# Altium footprint library Module's & Board's.PcbLib: 19 footprints (part 1 of 2)
Each footprint in its own frame and in the unit in brackets; x right, y up, seen from the top. Pads: shape width x height; smd on the part's side, far side on the other; paste and mask are expansions set on the pad; w line width, h text height; cw(c..) or ccw(c..) is an arc to the next point about the centre after c.
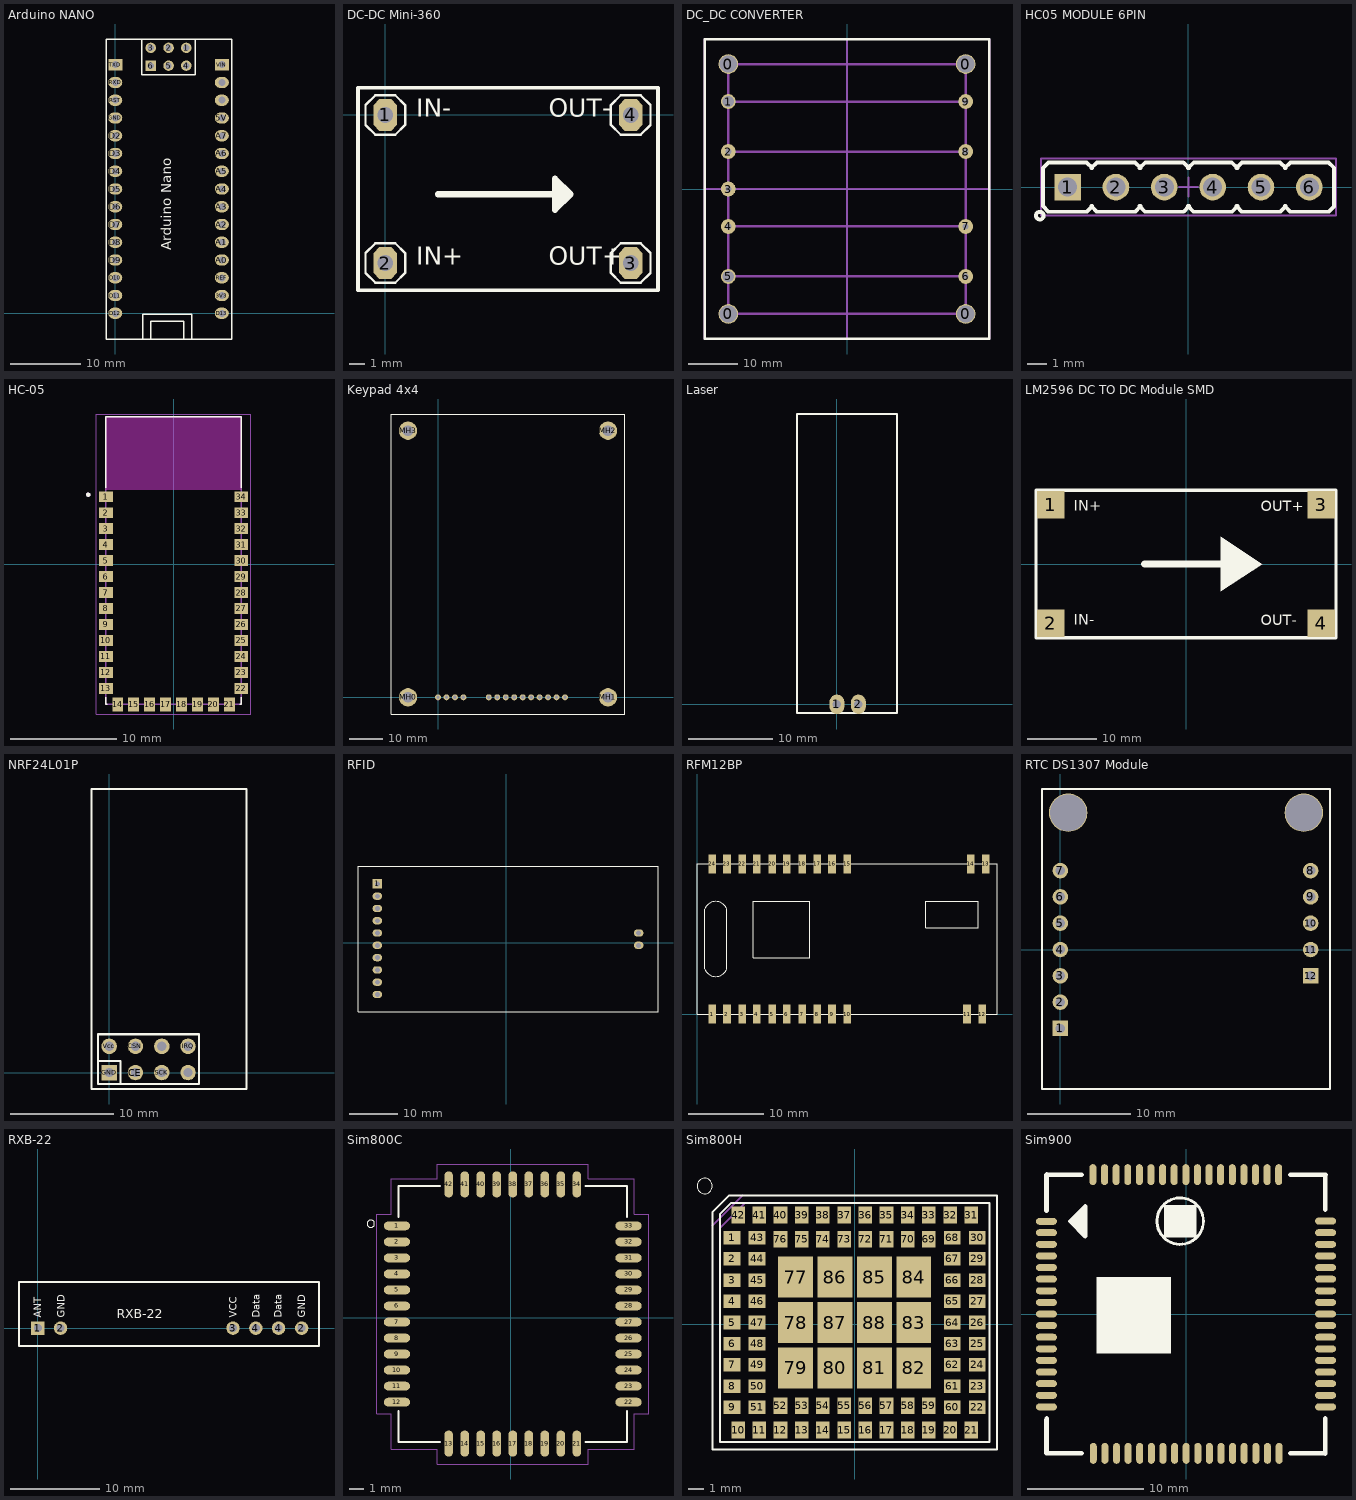
[diagram p0: the footprints below, top view; thin cyan lines are the x and y axes]

## Arduino NANO [mm]
pads (36):
  round 1.5 hole 0.9: 1(10.16,37.973) 2(7.62,37.973) 3(5.08,37.973) 4(10.16,35.433) 5(7.62,35.433)
  oval 2x1.6 hole 1: 3V3(15.24,2.54) 5V(15.24,27.94) A0(15.24,7.62) A1(15.24,10.16) A2(15.24,12.7) A3(15.24,15.24) A4(15.24,17.78) A5(15.24,20.32) A6(15.24,22.86) A7(15.24,25.4) D2(0,25.4) D3(0,22.86) D4(0,20.32) D5(0,17.78) D6(0,15.24) D7(0,12.7) D8(0,10.16) D9(0,7.62) D10(0,5.08) D11(0,2.54) D12(0,0) D13(15.24,0) GND(0,27.94) GND1(15.24,33.02) REF(15.24,5.08) RST(0,30.48) RST1(15.24,30.48) RXD(0,33.02)
  rect 1.5x1.5 hole 0.9: 6(5.08,35.433)
  rect 2x1.6 hole 1: TXD(0,35.56) VIN(15.24,35.56)
Top Overlay:
  lines w0.2: 3.81,39.243 3.81,34.163 11.43,34.163 11.43,39.243 ; 3.937,-3.683 3.937,-0.127 10.922,-0.127 10.922,-3.683 ; 5.08,-3.683 5.08,-1.143 9.779,-1.143 9.779,-3.683 ; -1.27,-3.683 16.637,-3.683 16.637,39.243 -1.27,39.243 -1.27,-3.683
  text "Arduino Nano" at 8.001,9.017 h1.4
3D body "PBD-2.stp": height 8.5, standoff -3.15, extent 6.35,34.163 8.89,39.243
3D body "PBD-2.stp": height 8.5, standoff -3.15, extent 3.81,34.163 6.35,39.243
3D body "PBD-2.stp": height 8.5, standoff -3.15, extent 8.89,34.163 11.43,39.243
3D body "PBS-1.stp": height 8.5, standoff -3.15, extent -1.27,34.29 1.27,36.83
3D body "PBD-2.stp": height 8.5, standoff -3.15, extent -1.27,-1.27 1.27,3.81
3D body "PBD-2.stp": height 8.5, standoff -3.15, extent -1.27,3.81 1.27,8.89
3D body "PBD-2.stp": height 8.5, standoff -3.15, extent -1.27,8.89 1.27,13.97
3D body "PBD-2.stp": height 8.5, standoff -3.15, extent -1.27,13.97 1.27,19.05
3D body "PBD-2.stp": height 8.5, standoff -3.15, extent -1.27,19.05 1.27,24.13
3D body "PBD-2.stp": height 8.5, standoff -3.15, extent -1.27,24.13 1.27,29.21
3D body "PBD-2.stp": height 8.5, standoff -3.15, extent -1.27,29.21 1.27,34.29
3D body "PBS-1.stp": height 8.5, standoff -3.15, extent 13.97,34.29 16.51,36.83
3D body "PBD-2.stp": height 8.5, standoff -3.15, extent 13.97,-1.27 16.51,3.81
3D body "PBD-2.stp": height 8.5, standoff -3.15, extent 13.97,3.81 16.51,8.89
3D body "PBD-2.stp": height 8.5, standoff -3.15, extent 13.97,8.89 16.51,13.97
3D body "PBD-2.stp": height 8.5, standoff -3.15, extent 13.97,13.97 16.51,19.05
3D body "PBD-2.stp": height 8.5, standoff -3.15, extent 13.97,19.05 16.51,24.13
3D body "PBD-2.stp": height 8.5, standoff -3.15, extent 13.97,24.13 16.51,29.21
3D body "PBD-2.stp": height 8.5, standoff -3.15, extent 13.97,29.21 16.51,34.29
3D body "User Library-arduino_nano.STEP": height 21.1, standoff 2.5, extent -1.27,-5.609 16.73,39.391

## DC-DC Mini-360 [mil]
pads (4):
  oct 60x80 hole 40: 1(0,0) 2(0,-374.02) 3(620.08,-374.02) 4(620.08,0)
Top Overlay:
  rectangle: -10,-10 10,10
  rectangle: 610.08,-10 630.08,10
  rectangle: -10,-384.02 10,-364.02
  rectangle: 610.08,-384.02 630.08,-364.02
  lines w6: -50,-399.02 -25,-424.02 25,-424.02 50,-399.02 50,-349.02 25,-324.02 -25,-324.02 -50,-349.02 -50,-399.02 ; -50,-25 -25,-50 25,-50 50,-25 50,25 25,50 -25,50 -50,25 -50,-25 ; 570.08,-399.02 595.08,-424.02 645.08,-424.02 670.08,-399.02 670.08,-349.02 645.08,-324.02 595.08,-324.02 570.08,-349.02 570.08,-399.02 ; 570.08,-25 595.08,-50 645.08,-50 670.08,-25 670.08,25 645.08,50 595.08,50 570.08,25 570.08,-25
  lines w9.84: -68.9,-442.91 688.98,-442.91 688.98,68.9 -68.9,68.9 -68.9,-442.91
  lines w15.75: 133.43,-200 468.07,-200 ; 437,-182.15 440,-219.15 ; 448,-209.15 448,-187.15 ; 428.7,-160.63 468.07,-200 ; 428.7,-160.63 468.07,-200 ; 428.7,-160.63 428.7,-239.37 468.07,-200
  text "IN-" at 78.74,-19.68 h78.74
  text "IN+" at 78.74,-393.7 h78.74
  text "OUT-" at 413.39,-19.68 h78.74
  text "OUT+" at 413.39,-393.7 h78.74
3D body "PLS-1.step": height 336.22, standoff -114.17, extent -49,-49.99 51,50.01
3D body "PLS-1.step": height 336.22, standoff -114.17, extent 571.08,-49.99 671.08,50.01
3D body "PLS-1.step": height 336.22, standoff -114.17, extent -49,-424.01 51,-324.01
3D body "PLS-1.step": height 336.22, standoff -114.17, extent 571.08,-424.01 671.08,-324.01

## DC_DC CONVERTER [mm] "VHD150-12S12"
height 20
pads (13):
  round 4 hole 3.5: 0(-24.13,-25.4) 0(-24.13,25.4) 0(24.13,-25.4) 0(24.13,25.4)
  round 3 hole 2.3: 1(-24.13,17.78) 5(-24.13,-17.78)
  round 3 hole 1.2: 2(-24.13,7.62) 3(-24.13,0) 4(-24.13,-7.62) 6(24.13,-17.78) 7(24.13,-7.62) 8(24.13,7.62) 9(24.13,17.78)
Top Overlay:
  lines w0.5: -28.956,-30.48 28.956,-30.48 28.956,30.48 -28.956,30.48 -28.956,-30.48
Mechanical 15:
  lines w0.5: -28.9,0 0,0 ; -24.13,-17.78 24.13,-17.78 ; -24.13,-7.62 24.13,-7.62 ; -24.13,7.62 24.13,7.62 ; -24.13,17.78 23.876,17.78 ; 24.13,22.86 24.13,25.4 ; 0,-30.5 -28.9,-30.5 -28.9,30.5 0,30.5 ; 0,-30.5 28.9,-30.5 28.9,0 ; 0,-30.5 0,0 ; 0,0 0,30.5 ; 0,0 28.9,0 ; 0,30.5 28.9,30.5 28.9,0 ; 24.13,25.4 0,25.4 -24.13,25.4 -24.13,0 -24.13,-25.4 0,-25.4 24.13,-25.4 24.13,0 24.13,25.4
3D body "User Library-Cosel_CBS200.STEP": height 13, standoff -4.78, extent -29.083,-30.65 29.117,30.65

## HC05 MODULE 6PIN [mm] "HC05 box-Designer Abbas Basereh"
height 40
pads (6):
  rect 1.4x1.4 / inner rect 1.4x1.4 / far side rect 1.4x2.2 hole 1 mask+0.1: 1(-6.35,0)
  round 1.4 / inner round 1.4 / far side oval 1.4x2.2 hole 1 mask+0.1: 2(-3.81,0) 3(-1.27,0) 4(1.27,0) 5(3.81,0) 6(6.35,0)
Top Overlay:
  circle w0.2: c-7.81,-1.5 r0.2
  lines w0.2: -5.11,-1 -4.81,-1.3 -2.81,-1.3 -2.51,-1 ; -5.11,1 -4.81,1.3 -2.81,1.3 -2.51,1 ; -5.05,-1 -5.35,-1.3 -7.35,-1.3 -7.65,-1 -7.65,1 -7.35,1.3 -5.35,1.3 -5.05,1 ; -2.57,-1 -2.27,-1.3 -0.27,-1.3 0.03,-1 ; -2.57,1 -2.27,1.3 -0.27,1.3 0.03,1 ; -0.025,-1 0.275,-1.3 2.275,-1.3 2.575,-1 ; -0.025,1 0.275,1.3 2.275,1.3 2.575,1 ; 2.515,-1 2.815,-1.3 4.815,-1.3 5.115,-1 ; 2.515,1 2.815,1.3 4.815,1.3 5.115,1 ; 5.055,-1 5.355,-1.3 7.355,-1.3 7.64,-1.015 7.64,1.015 7.355,1.3 5.355,1.3 5.055,1
Mechanical 15:
  lines w0.1: -0.5,0 0.5,0 ; 0,-0.5 0,0.5 ; -7.75,-1.5 7.75,-1.5 7.75,1.5 -7.75,1.5 -7.75,-1.5
3D body "User Library-hc05.STEP": height 40, standoff -2.6, extent -8.025,-0.5 8.075,5.4

## HC-05 [mm]
pads (34):
  rect 1.3x1 smd: 1(-6.35,6.325) 2(-6.35,4.825) 3(-6.35,3.325) 4(-6.35,1.825) 5(-6.35,0.325) 6(-6.35,-1.175) 7(-6.35,-2.675) 8(-6.35,-4.175) 9(-6.35,-5.675) 10(-6.35,-7.175) 11(-6.35,-8.675) 12(-6.35,-10.175) 13(-6.35,-11.675) 22(6.35,-11.675) 23(6.35,-10.175) 24(6.35,-8.675) 25(6.35,-7.175) 26(6.35,-5.675) 27(6.35,-4.175) 28(6.35,-2.675) 29(6.35,-1.175) 30(6.35,0.325) 31(6.35,1.825) 32(6.35,3.325) 33(6.35,4.825) 34(6.35,6.325)
  rect 1x1.3 smd: 14(-5.25,-13.175) 15(-3.75,-13.175) 16(-2.25,-13.175) 17(-0.75,-13.175) 18(0.75,-13.175) 19(2.25,-13.175) 20(3.75,-13.175) 21(5.25,-13.175)
Top Overlay:
  circle w0.2: c-8,6.5 r0.1
  lines w0.127: -6.35,-12.495 -6.35,-13.175 -6.22,-13.175 ; -6.35,7.145 -6.35,13.825 6.35,13.825 6.35,7.145 ; 6.22,-13.175 6.35,-13.175 6.35,-12.495
Keep-Out Layer:
  region: 6.35,6.95 -6.35,6.95 -6.35,13.85 6.35,13.85
  region: 6.35,6.95 -6.35,6.95 -6.35,13.85 6.35,13.85
  region: 6.35,6.95 -6.35,6.95 -6.35,13.85 6.35,13.85
Mechanical 13:
  circle w0.2: c-8,6.5 r0.1
  lines w0.127: -6.35,-13.175 6.35,-13.175 6.35,13.825 -6.35,13.825 -6.35,-13.175
Mechanical 15:
  lines w0.05: -7.25,-14.075 7.25,-14.075 7.25,14.075 -7.25,14.075 -7.25,-14.075
3D body "User Library-HC05(06).step": height 4.31, standoff 0, extent -6.5,-13.5 6.5,13.5

## Keypad 4x4 [mil] "Matrix Keyboard 4x4"
pads (18):
  round 70 hole 40: 1(0,0) 2(100,0) 3(200,0) 4(300,0) 5(700,0) 6(800,0) 7(900,0) 8(1000,0) 9(600,0) 10(1100,0) 11(1200,0) 12(1300,0) 13(1400,0) 14(1500,0)
  round 216.54 hole 125.98: MH0(-354.33,0) MH1(2007.87,0) MH2(2007.87,3149.61) MH3(-354.33,3149.61)
Top Overlay:
  lines w10: -551.18,-196.85 2204.72,-196.85 2204.72,3346.46 -551.18,3346.46 -551.18,-196.85
3D body "Keyboard.STEP": height 874.82, standoff 590.55, extent -551.18,-196.85 2204.72,3346.46
3D body "Spacer.STEP": height 590.55, standoff -196.85, extent 1895.36,3052.17 2120.39,3247.05
3D body "Spacer.STEP": height 590.55, standoff -196.85, extent 1895.36,-97.44 2120.39,97.44
3D body "Spacer.STEP": height 590.55, standoff -196.85, extent -466.84,-97.44 -241.81,97.44
3D body "Spacer.STEP": height 590.55, standoff -196.85, extent -466.85,3052.16 -241.82,3247.05
3D body "header10-15mm.STEP": height 710, standoff -100, extent 550,-50 1550,50
3D body "header04-15mm.STEP": height 710, standoff -100, extent -50,-50 350,50

## Laser [mil]
pads (2):
  oval 70x90 hole 40: 1(0,0) 2(100,0)
Top Overlay:
  lines w10: -186.22,-40 -186.22,1349.21 280,1349.21 280,-40 -186.22,-40
3D body "laser.STEP": height 472.44, standoff 0, extent -186.22,50 286.22,1435.83
3D body: height 241.21, standoff 231.23, extent 45,1160 54.96,2160

## LM2596 DC TO DC Module SMD [mm]
pads (4):
  rect 4x4 smd: 1(-19.55,8.55) 2(-19.55,-8.55) 3(19.55,8.55) 4(19.55,-8.55)
Top Overlay:
  region: 5,3.925 5,-3.975 11,-0.025
  lines w0.5: -21.7,-10.7 -21.7,10.7 21.7,10.7 21.7,-10.7 -21.7,-10.7
  lines w1: -6,0 5.775,0
  text "OUT-" at 10.829,-8.896 h1.52
  text "OUT+" at 10.829,7.604 h1.52
  text "IN-" at -16.272,-8.794 h1.52
  text "IN+" at -16.272,7.723 h1.52
3D body "User Library-BULVACK LM2596 DC-DC 1_25V-30V 3A-1.step": height 12.95, standoff -0.65, extent -21.65,-10.65 21.65,10.65

## NRF24L01P [mm] "NRFL01+ Module"
pads (8):
  round 1.5 hole 0.9: CE(2.54,0) CSN(2.54,2.54) IRQ(7.62,2.54) MISO(7.62,0) MOSI(5.08,2.54) SCK(5.08,0) Vcc(0,2.54)
  rect 1.5x1.5 hole 0.9: GND(0,0)
Top Overlay:
  lines w0.2: -1.1,1.1 1.1,1.1 1.1,-1.1 ; -1.72,-1.59 -1.72,27.41 13.28,27.41 13.28,-1.59 -1.72,-1.59 ; -1.1,-1.1 8.7,-1.1 8.7,3.7 -1.1,3.7 -1.1,-1.1
3D body "User Library-NRF24L01P Module.STEP": height 15.5, standoff 0.59, extent -1.72,-1.59 13.28,27.41

## RFID [mm] "RFID 2&10 PIN"
pads (12):
  rect 2x2 hole 1: 1(-26.632,12.141)
  oval 2x1.5 hole 1: 2(-26.632,9.601) 3(-26.632,7.061) 4(-26.632,4.521) 5(-26.632,1.981) 6(-26.632,-0.559) 7(-26.632,-3.099) 8(-26.632,-5.639) 9(-26.632,-8.179) 10(-26.632,-10.719) 11(27.368,1.981) 12(27.368,-0.559)
Top Overlay:
  lines w0.2: -30.632,-14.249 -30.632,15.751 31.368,15.751 31.368,-14.249 -30.632,-14.249
3D body: height 11.1, standoff 0, extent 5.639,-2.184 11.659,6.096
3D body: height 11.1, standoff 0, extent 1.448,-2.21 2.946,6.096
3D body: height 11.1, standoff 0, extent -5.232,-2.261 -0.584,6.096
3D body: height 11.1, standoff 0, extent -13.614,-2.184 -6.579,6.426
3D body: height 11, standoff 0, extent -30.632,-14.249 31.369,15.723

## RFM12BP [mm]
pads (24):
  rect 1x2.5 smd mask+0.5: 1(2,0) 2(4,0) 3(6,0) 4(8,0) 5(10,0) 6(12,0) 7(14,0) 8(16,0) 9(18,0) 10(20,0) 11(36,0) 12(38,0) 13(38.5,20) 14(36.5,20) 15(20,20) 16(18,20) 17(16,20) 18(14,20) 19(12,20) 20(10,20) 21(8,20) 22(6,20) 23(4,20) 24(2,20)
Top Overlay:
  lines w0.1: 0,0 40,0 40,20 0,20 0,0 ; 1,6 ccw(c2.5,6.625) 4,6 4,7.5 4,14 ccw(c2.5,13.375) 1,14 1,7.5 1,6 ; 7.5,7.5 7.5,10 7.5,15 15,15 15,7.5 7.5,7.5 ; 30.5,11.5 30.5,14.5 30.5,15 37.5,15 37.5,11.5 30.5,11.5

## RTC DS1307 Module [mm]
height 8
pads (14):
  rect 1.5x1.5 hole 0.9: 1(0,-7.62) 12(24.155,-2.54)
  round 1.5 hole 0.9: 2(0,-5.08) 3(0,-2.54) 4(0,0) 5(0,2.54) 6(0,5.08) 7(0,7.62) 8(24.155,7.62) 9(24.155,5.08) 10(24.155,2.54) 11(24.155,0)
  round 3.7 hole 3.5: ""(0.762,13.208) ""(23.495,13.208)
Top Overlay:
  lines w0.2: -1.778,-13.462 -1.778,15.494 26.035,15.494 26.035,-13.462 -1.778,-13.462
3D body "PBS-1.stp": height 8.5, standoff -3.15, extent 22.885,6.35 25.425,8.89
3D body "PBD-2.stp": height 8.5, standoff -3.15, extent 22.885,-3.81 25.425,1.27
3D body "PBD-2.stp": height 8.5, standoff -3.15, extent 22.885,1.27 25.425,6.35
3D body "PBD-2.stp": height 8.5, standoff -3.15, extent -1.27,1.27 1.27,6.35
3D body "PBD-2.stp": height 8.5, standoff -3.15, extent -1.27,-3.81 1.27,1.27
3D body "PBD-2.stp": height 8.5, standoff -3.15, extent -1.27,-8.89 1.27,-3.81
3D body "PBS-1.stp": height 8.5, standoff -3.15, extent -1.27,6.35 1.27,8.89

## RXB-22 [mm]
pads (6):
  rect 1.5x1.5 hole 0.9: 1(0,0)
  round 1.5 hole 0.9: 2(2.54,0) 2(29.44,0) 3(21.78,0) 4(24.32,0) 4(26.86,0)
Top Overlay:
  lines w0.203: -2.1,-2 -2.1,5.15 31.375,5.15 31.375,-2 -2.1,-2
  text "GND" at 29.825,1.175 h0.8
  text "RXB-22" at 8.8,1.125 h1
  text "Data" at 27.225,1.175 h0.8
  text "Data" at 24.775,1.175 h0.8
  text "VCC" at 22.175,1.175 h0.8
  text "GND" at 3.025,1.175 h0.8
  text "ANT" at 0.375,1.175 h0.8

## Sim800C [mm]
pads (42):
  oval 1.8x0.6 smd: 1(-7.823,6.304) 2(-7.823,5.204) 3(-7.823,4.104) 4(-7.823,3.004) 5(-7.823,1.904) 6(-7.823,0.804) 7(-7.823,-0.296) 8(-7.823,-1.396) 9(-7.823,-2.496) 10(-7.823,-3.596) 11(-7.823,-4.696) 12(-7.823,-5.796) 22(8.077,-5.796) 23(8.077,-4.696) 24(8.077,-3.596) 25(8.077,-2.496) 26(8.077,-1.396) 27(8.077,-0.296) 28(8.077,0.804) 29(8.077,1.904) 30(8.077,3.004) 31(8.077,4.104) 32(8.077,5.204) 33(8.077,6.304)
  oval 0.6x1.8 smd: 13(-4.273,-8.646) 14(-3.173,-8.646) 15(-2.073,-8.646) 16(-0.973,-8.646) 17(0.127,-8.646) 18(1.227,-8.646) 19(2.327,-8.646) 20(3.427,-8.646) 21(4.527,-8.646) 34(4.527,9.154) 35(3.427,9.154) 36(2.327,9.154) 37(1.227,9.154) 38(0.127,9.154) 39(-0.973,9.154) 40(-2.073,9.154) 41(-3.173,9.154) 42(-4.273,9.154)
Top Overlay:
  circle w0: c-9.623,6.454 r0.254
  lines w0.127: -7.723,-6.396 -7.723,-8.546 -4.873,-8.546 ; -7.723,6.904 -7.723,9.054 -4.873,9.054 ; 5.127,-8.546 7.977,-8.546 7.977,-6.396 ; 5.127,9.054 7.977,9.054 7.977,6.904
Mechanical 1:
  lines w0.05: -9.223,-6.596 -8.223,-6.596 -8.223,-9.046 -5.073,-9.046 -5.073,-10.046 5.327,-10.046 5.327,-9.046 8.477,-9.046 8.477,-6.596 9.477,-6.596 9.477,7.104 8.477,7.104 8.477,9.554 5.327,9.554 5.327,10.554 -5.073,10.554 -5.073,9.554 -8.223,9.554 -8.223,7.104 -9.223,7.104 -9.223,-6.596
3D body "User Library-SIM800C.STEP": height 2.3, standoff -0.01, extent -7.723,-8.546 7.977,9.054

## Sim800H [mm]
pads (88):
  rect 1.1x0.9 smd: 1(-8.1,5.727) 2(-8.1,4.327) 3(-8.1,2.927) 4(-8.1,1.527) 5(-8.1,0.127) 6(-8.1,-1.273) 7(-8.1,-2.673) 8(-8.1,-4.073) 9(-8.1,-5.473) 22(8.1,-5.473) 23(8.1,-4.073) 24(8.1,-2.673) 25(8.1,-1.273) 26(8.1,0.127) 27(8.1,1.527) 28(8.1,2.927) 29(8.1,4.327) 30(8.1,5.727) 43(-6.45,5.727) 44(-6.45,4.327) 45(-6.45,2.927) 46(-6.45,1.527) 47(-6.45,0.127) 48(-6.45,-1.273) 49(-6.45,-2.673) 50(-6.45,-4.073) 51(-6.45,-5.473) 60(6.45,-5.473) 61(6.45,-4.073) 62(6.45,-2.673) 63(6.45,-1.273) 64(6.45,0.127) 65(6.45,1.527) 66(6.45,2.927) 67(6.45,4.327) 68(6.45,5.727)
  rect 0.9x1.1 smd: 10(-7.7,-6.973) 11(-6.3,-6.973) 12(-4.9,-6.973) 13(-3.5,-6.973) 14(-2.1,-6.973) 15(-0.7,-6.973) 16(0.7,-6.973) 17(2.1,-6.973) 18(3.5,-6.973) 19(4.9,-6.973) 20(6.3,-6.973) 21(7.7,-6.973) 31(7.7,7.227) 32(6.3,7.227) 33(4.9,7.227) 34(3.5,7.227) 35(2.1,7.227) 36(0.7,7.227) 37(-0.7,7.227) 38(-2.1,7.227) 39(-3.5,7.227) 40(-4.9,7.227) 41(-6.3,7.227) 42(-7.7,7.227) 52(-4.9,-5.373) 53(-3.5,-5.373) 54(-2.1,-5.373) 55(-0.7,-5.373) 56(0.7,-5.373) 57(2.1,-5.373) 58(3.5,-5.373) 59(4.9,-5.373) 69(4.9,5.627) 70(3.5,5.627) 71(2.1,5.627) 72(0.7,5.627) 73(-0.7,5.627) 74(-2.1,5.627) 75(-3.5,5.627) 76(-4.9,5.627)
  rect 2.3x2.7 smd: 77(-3.9,3.127) 78(-3.9,0.127) 79(-3.9,-2.873) 80(-1.3,-2.873) 81(1.3,-2.873) 82(3.9,-2.873) 83(3.9,0.127) 84(3.9,3.127) 85(1.3,3.127) 86(-1.3,3.127) 87(-1.3,0.127) 88(1.3,0.127)
Top Overlay:
  circle w0: c-9.906,9.144 r0.508
  lines w0.127: -9.4,-8.273 -9.4,7.409 -8.282,8.527 -7.402,8.527 -7.4,8.527 9.4,8.527 9.4,-8.273 -9.4,-8.273 ; -8.9,-7.773 -8.9,7.265 -8.138,8.027 8.9,8.027 8.9,-7.773 -8.9,-7.773
Mechanical 1:
  lines w0.127: -9.4,6.529 -7.402,8.527 ; -8.9,6.349 -7.222,8.027
3D body "User Library-SIM800H.STEP": height 2.42, standoff 0, extent -8.9,-7.773 8.9,8.027

## Sim900 [mm]
pads (68):
  oval 1.8x0.6 smd mask+0.102: 1(-12.016,7.981) 2(-12.016,7) 3(-12.016,6) 4(-12.016,5) 5(-12.016,4) 6(-12.016,3) 7(-12.016,2) 8(-12.016,1) 9(-12.016,0) 10(-12.016,-1) 11(-12.016,-2) 12(-12.016,-3) 13(-12.016,-4) 14(-12.016,-5) 15(-12.016,-6) 16(-12.016,-7) 17(-12.016,-8) 35(12.016,-8) 36(12.016,-7) 37(12.016,-6) 38(12.016,-5) 39(12.016,-4) 40(12.016,-3) 41(12.016,-2) 42(12.016,-1) 43(12.016,0) 44(12.016,1) 45(12.016,1.994) 46(12.016,3) 47(12.016,4) 48(12.016,5) 49(12.016,6) 50(12.016,7) 51(12.016,8)
  oval 0.6x1.8 smd mask+0.102: 18(-7.985,-12) 19(-6.984,-12) 20(-5.985,-12) 21(-4.985,-12) 22(-3.985,-12) 23(-2.984,-12) 24(-1.984,-12) 25(-0.985,-12) 26(0.015,-12) 27(1.015,-12) 28(2.016,-12) 29(3.015,-12) 30(4.015,-12) 31(5.01,-12) 32(6.015,-12) 33(7.016,-12) 34(8.016,-12) 52(7.984,12) 53(6.984,12) 54(5.984,12) 55(4.984,12) 56(3.984,12) 57(2.984,12) 58(1.984,12) 59(0.984,12) 60(-0.016,12) 61(-1.016,12) 62(-2.016,12) 63(-3.016,12) 64(-4.016,12) 65(-5.016,12) 66(-6.016,12) 67(-7.016,12) 68(-8.016,12)
Top Layer:
  lines w0.4: 12,-0.984 12.016,-1
Top Overlay:
  circle w0.254: c-0.5,8 r2
  rectangle: -7.7,-3.4 -1.3,3.2
  rectangle: -1.9,6.6 0.9,9.4
  lines w0.4: -12.016,-9.1 -12.016,-12 -9,-12 ; -12.016,8.9 -12.016,12 -9,12 -11.984,12 ; -12,-11.984 -12,-9 ; -12,9 -12,12.016 ; -9.433,7.474 -9.433,8.44 ; -9.046,7.099 -9.046,8.877 ; -8.671,7.982 -9.941,7.982 ; 9,-12 11.984,-12 11.984,-9.1 ; 11.966,12 9,12 12.016,12 ; 11.984,9.1 11.984,12 ; 12,-12.015 12,-9 ; 12,9 12,11.985 ; -9.941,7.982 -8.671,6.712 -8.671,9.252 -9.941,7.982 ; -7.285,-2.8 -1.685,-2.8 -1.685,2.8 -7.285,2.8 -7.285,-2.8
3D body "User Library-SIM900.STEP": height 3.02, standoff 0, extent -11.989,-12.005 12.011,11.995